# Altium schematic symbol library lib_datalogger.SchLib: 1246 symbols (part 3 of 16) (continued)
## CMP-004-000022-2 (continued)
SAMSUNG ELECTRO-MECHANICS - CL10C150JB8NNNC - CAP, 15PF, 50V, MLCC, 0603; Temperature Coefficient: 300ppm/°C; Dielectric: C0G; Material: Ceramic; ComponentLink3Description: https://datasheet.ciiva.com/16291/cl05b104kq5nnnc-16291631.pdf?src-supplier=Future+Electronics; ComponentLink2URL: https://datasheet.ciiva.com/29198/457290-da-01-en-vs-kondensator-0603-29198776.pdf?src-supplier=Conrad; Voltage: 50V; Design Item ID: CAP CER 15pF 50V NPO 0603 SMD; Mount: Surface Mount; Series: CL; Stock 1: 171550; Voltage Rating (DC): 50V; ComponentLink3URL: https://datasheet.ciiva.com/16291/cl05b104kq5nnnc-16291631.pdf?src-supplier=Future+Electronics; Manufacturer Part Number: CL10C150JB8NNNC; Thickness: 0.035inch; Radiation Hardening: No; ComponentLink1URL: https://datasheet.ciiva.com/15195/getdatasheetpartid-466951-15195798.pdf?src-supplier=Verical; Lead Free: Lead Free; Construction: Flat; Width: 0.031inch; Height: 0.8mm; Category: Ceramic Capacitors; Depth: 0.8mm; Source: mits.SchLib; Pricing 1: 50=0,00900, 500=0,00690, 1500=0,00650, 5000=0,00610, 25000=0,00600, 50000=0,00590, 50=0,00870, 500=0,00670, 1500=0,00630, 5000=0,00590, 25000=0,00580, 50000=0,00570, 50=0,04530, 500=0,03480, 1500=0,03290, 5000=0,03090, 25000=0,03020, 50000=0,02960, 50=0,04360, 500=0,03350, 1500=0,03160, 5000=0,02970, 25000=0,02910, 50000=0,02840, 50=0,00590, 500=0,00450, 1500=0,00420, 5000=0,00400, 25000=0,00390, 50000=0,00380, 50=0,00500, 500=0,00380, 1500=0,00360, 5000=0,00340, 25000=0,00330, 50000=0,00330, 50=0,05360, 500=0,04120, 1500=0,03890, 5000=0,03650, 25000=0,03580, 50000=0,03500, 50=0,75810, 500=0,58230, 1500=0,54930, 5000=0,51640, 25000=0,50540, 50000=0,49440, 50=0,02860, 500=0,02200, 1500=0,02070, 5000=0,01950, 25000=0,01910, 50000=0,01860, 50=0,52200, 500=0,40090, 1500=0,37830, 5000=0,35560, 25000=0,34800, 50000=0,34040, 50=0,05990, 500=0,04600, 1500=0,04340, 5000=0,04080, 25000=0,03990, 50000=0,03910, 50=0,00930, 500=0,00710, 1500=0,00670, 5000=0,00630, 25000=0,00620, 50000=0,00610, 50=0,00690, 500=0,00530, 1500=0,00500, 5000=0,00470, 25000=0,00460, 50000=0,00450 (AUD); Length: 1.6mm; ComponentLink1Description: https://datasheet.ciiva.com/15195/getdatasheetpartid-466951-15195798.pdf?src-supplier=Verical; Case Code (Imperial): 0603; Contact Plating: Tin; RoHS: Yes; Case Code (Metric): 1608; ComponentLink2Description: https://datasheet.ciiva.com/29198/457290-da-01-en-vs-kondensator-0603-29198776.pdf?src-supplier=Conrad
footprint CC1005-0402 (Chip Capacitor; Body 0.039" L x 0.020" W (1.00mm x 0.50mm))
footprint CC1608-0603 (Chip Capacitor; Body 1.6 x 0.8 mm (LxW typ))
pins: 1, 2

## CMP-004-00022-3
designator D?, comment 1SS400CSFH
Switching Diode (High Speed Switching), 80 V, 100 mA, 2-Pin SOD-923, RoHS, Tape and Reel; Pins: 2; Mounting Technology: SMT
footprint ROHM-VMN2-2_V (VMN2, 2-Leads, Body 0.9x0.6mm, Pitch 0.95mm)
footprint ROHM-VMN2-2_V (VMN2, 2-Leads, Body 0.9x0.6mm, Pitch 0.95mm)
pins: 1 K, 2 A

## CMP-004-000023-2
designator C?, comment CAP CER 18PF 50V NP0 0805 SMD  Packaging: Cut Tape (CT)  Capacitance: 18pF  Tolerance: ±10%  Manufacturer: Kemet
CAP CER 18PF 50V NP0 0805; Manufacturer Part Number: C0805C180K5GACTU; Temperature Coefficient: C0G, NP0; Lead Spacing: -; Ratings: -; ComponentLink1URL: http://www.kemet.com/docfinder?Partnumber=C0805C180K5GACTU; Thickness (Max): 0.035" (0.88mm); Mounting Type: Surface Mount, MLCC; Applications: General Purpose; Operating Temperature: -55°C ~ 125°C; Source: mits.SchLib; Category: Capacitors; Design Item ID: CAP CER 18PF 50V NP0 0805 SMD; Pricing 1: 1=0.1, 10=0.057, 50=0.0312, 100=0.0255, 250=0.02132, 500=0.0182, 1000=0.0143 (USD); Voltage - Rated: 50V; Lead Style: -; ComponentLink1Description: http://www.kemet.com/docfinder?Partnumber=C0805C180K5GACTU; RoHS: RoHS Compliant; Package / Case: 0805 (2012 Metric); Height - Seated (Max): -; Stock 1: 48709; Features: Low ESL; Size / Dimension: 0.079" L x 0.049" W (2.00mm x 1.25mm)
footprint CC1005-0402 (Chip Capacitor; Body 0.039" L x 0.020" W (1.00mm x 0.50mm))
footprint CC2012-0805 (Chip Capacitor)
pins: 1, 2

## CMP-004-00023-3
designator D?, comment ESDA25P35-1U1M
TVS DIODE 22V 41V 1610; Peak Inverse Voltage: 23.3V; Max Surge Current: 35A; Mounting Technology: SMT; Case/Package: QFN1610 (0603); RoHS Compliant: Yes; Pins: 2
footprint STM-QFN1610 (SMD, 2-Leads, Body 1.6x1mm)
footprint STM-QFN1610 (SMD, 2-Leads, Body 1.6x1mm)
pins: 1 A, 2 A

## CMP-004-000024-2
designator C?, comment CAP CER 20pF 50V NPO 0603 SMD  Tolerance: ±5%  Max Operating Temperature: 125°C  Packaging: Cut Tape (CT)  Capacitance: 47pF  Voltage Rating: 50V  RoHS Compliant: Yes  Min Operating Temperature: -55°C  Case/Package: 0603  Package Quantity: 1  Manufacturer: Kemet
20 pF, 50 V, 0603 [1608 Metric], ± 5%, C0G / NP0, CL Series; Manufacturer Part Number: C0603C470J1GACTU; Voltage - Rated: 100V; Temperature Coefficient: C0G, NP0; ComponentLink2URL: https://datasheet.ciiva.com/26877/getdatasheetpartid-640634-26877974.pdf?src-supplier=Verical; Height: 0.8mm; ComponentLink1Description: http://www.kemet.com/docfinder?Partnumber=C0603C470J1GACTU; Applications: General Purpose; Size / Dimension: 0.063" L x 0.031" W (1.60mm x 0.80mm); Package / Case: 0603 (1608 Metric); Pricing 2: 50=0,00820, 500=0,00630, 1500=0,00600, 5000=0,00560, 25000=0,00550, 50000=0,00540, 50=0,00790, 500=0,00610, 1500=0,00580, 5000=0,00540, 25000=0,00530, 50000=0,00520, 50=0,04120, 500=0,03140, 1500=0,03010, 5000=0,02810, 25000=0,02750, 50000=0,02680, 50=0,03970, 500=0,03030, 1500=0,02900, 5000=0,02710, 25000=0,02650, 50000=0,02590, 50=0,00530, 500=0,00410, 1500=0,00390, 5000=0,00360, 25000=0,00360, 50000=0,00350, 50=0,00460, 500=0,00350, 1500=0,00330, 5000=0,00310, 25000=0,00300, 50000=0,00300, 50=0,04890, 500=0,03730, 1500=0,03570, 5000=0,03340, 25000=0,03260, 50000=0,03190, 50=0,69060, 500=0,52610, 1500=0,50420, 5000=0,47130, 25000=0,46040, 50000=0,44940, 50=0,02610, 500=0,01990, 1500=0,01910, 5000=0,01780, 25000=0,01740, 50000=0,01700, 50=0,47890, 500=0,36490, 1500=0,34970, 5000=0,32690, 25000=0,31930, 50000=0,31170, 50=0,05440, 500=0,04150, 1500=0,03970, 5000=0,03720, 25000=0,03630, 50000=0,03540, 50=0,00850, 500=0,00650, 1500=0,00620, 5000=0,00580, 25000=0,00570, 50000=0,00550, 50=0,00630, 500=0,00480, 1500=0,00460, 5000=0,00430, 25000=0,00420, 50000=0,00410 (AUD); Lead Spacing: -; Case Code (Metric): 1608; Ratings: -; Design Item ID: CAP CER 20pF 50V NPO 0603 SMD; Case Code (Imperial): 0603; Lead Style: -; Depth: 0.8mm; ComponentLink2Description: https://datasheet.ciiva.com/26877/getdatasheetpartid-640634-26877974.pdf?src-supplier=Verical; Stock 2: 273250; Thickness: 0.035inch; Mounting Type: Surface Mount, MLCC; ComponentLink3URL: https://datasheet.ciiva.com/26310/mlcc-catalogdownload2013-eng-26310315.pdf?src-supplier=Distrelec; Length: 1.6mm; RoHS: RoHS Compliant; Radiation Hardening: No; Source: mits.SchLib; Operating Temperature: -55°C ~ 125°C; Construction: Flat; Voltage: 50V; Dielectric: C0G; ComponentLink1URL: http://www.kemet.com/docfinder?Partnumber=C0603C470J1GACTU; Mount: Surface Mount; Part Status: Active; Features: Low ESL; Thickness (Max): 0.034" (0.87mm); Width: 0.031inch; Category: Capacitors; Stock 1: 275177; ComponentLink3Description: https://datasheet.ciiva.com/26310/mlcc-catalogdownload2013-eng-26310315.pdf?src-supplier=Distrelec; Height - Seated (Max): -; Series: CL; Pricing 1: 1=0.1, 10=0.041, 50=0.0222, 100=0.0187, 250=0.01532, 500=0.0131, 1000=0.0102 (USD)
footprint CC1005-0402 (Chip Capacitor; Body 0.039" L x 0.020" W (1.00mm x 0.50mm))
footprint CC1608-0603 (Chip Capacitor; Body 1.6 x 0.8 mm (LxW typ))
pins: 1, 2

## CMP-004-00024-3
designator D?, comment MSS1P4-M3/89A
Schottky Diodes & Rectifiers 1.0 Amp 40 Volt; Forward Voltage: 460mV; Max Surge Current: 25A; Max Operating Temperature: 150°C; Min Operating Temperature: -55°C; Pins: 2; Mounting Technology: SMT
footprint MicroSMP (DO-219AD) (SOD, 2-Leads, Body 2.3x1.4mm)
footprint MicroSMP (DO-219AD) (SOD, 2-Leads, Body 2.3x1.4mm)
pins: 1 K, 2 A

## CMP-004-00025-1
designator U?, comment ESDR0502NMUTBG
Ultra Low Capacitance ESD Protection Array for High Speed Data Line Protection, 6-Pin UDFN, Pb-Free, Tape and Reel; ComponentLink2Description: Datasheet; ComponentLink3URL: http://www.onsemi.com/pub_link/Collateral/517AA.PDF; Mounting Technology: SMT; ComponentLink1URL: http://www.onsemi.com/; Pins: 6; ComponentLink3Description: Package Specification; ComponentLink1Description: Manufacturer URL; ComponentLink2URL: http://www.onsemi.cn/pub_link/Collateral/ESDR0502N-D.PDF
footprint ONSC-UDFN-6-517AA-01_V (SON, 6-Leads, Body 1.2x1mm, Pitch 0.4mm)
footprint ONSC-UDFN-6-517AA-01_V (SON, 6-Leads, Body 1.2x1mm, Pitch 0.4mm)
pins: 1 GND (power), 2 NC, 3 NC, 4 D-, 5 D+, 6 VBUS (power)

## CMP-004-000025-2
designator C?, comment CAP CER 22nF 50V C0G 1206 SMD  Tolerance: ±5%  Capacitance: 0.022µF  Packaging: Cut Tape (CT)  Manufacturer: TDK Corporation
CAP CER 0.022UF 50V C0G 1206; Manufacturer Part Number: C3216C0G1H223J060AA; Temperature Coefficient: C0G, NP0; Operating Temperature: -55°C ~ 125°C; Failure Rate: -; Package / Case: 1206 (3216 Metric); Source: mits.SchLib; Applications: General Purpose; Lead Spacing: -; Height - Seated (Max): -; Stock 1: 9101; Size / Dimension: 0.126" L x 0.063" W (3.20mm x 1.60mm); Design Item ID: CAP CER 22nF 50V C0G 1206 SMD; Thickness (Max): 0.028" (0.70mm); RoHS: RoHS Compliant; Mounting Type: Surface Mount, MLCC; Ratings: -; ComponentLink1Description: https://product.tdk.com/info/en/catalog/datasheets/mlcc_commercial_general_en.pdf; Voltage - Rated: 50V; Category: Capacitors; Features: Low ESL; Part Status: Active; ComponentLink1URL: https://product.tdk.com/info/en/catalog/datasheets/mlcc_commercial_general_en.pdf; Lead Style: -; Pricing 1: 1=0.48, 10=0.417, 100=0.2086, 250=0.16684, 500=0.15196, 1000=0.13706 (USD)
footprint CC1005-0402 (Chip Capacitor; Body 0.039" L x 0.020" W (1.00mm x 0.50mm))
footprint CC3216-1206 (Chip Capacitor; Body 3.2 x 1.6 mm (LxW typ))
pins: 1, 2

## CMP-004-000026-2
designator C?, comment CAP CER 22pF 50V C0G 0603 SMD  Packaging: Tape and Reel  Manufacturer: Samsung  Voltage Rating: 50V  Package Quantity: 1  Case/Package: 0603  Max Operating Temperature: 125°C  Tolerance: 5%  Min Operating Temperature: -55°C  Capacitance: 22pF  RoHS Compliant: Yes
Ceramic capacitor SMD-0603 22pF /50V NP0# J +-5%, Samsung, RoHS; Manufacturer Part Number: CL10C220JB8NNNC; Temperature Coefficient: 300ppm/°C; ComponentLink4URL: https://datasheet.ciiva.com/16440/l0005e-16440552.pdf?src-supplier=Future+Electronics; Case Code (Metric): 1608; Length: 0.063inch; RoHS: Yes; ComponentLink6Description: https://datasheet.ciiva.com/25803/cl10c220jb8nnnc-25803014.pdf?src-supplier=Digi-Key; Series: CL; Mount: Surface Mount; ComponentLink8Description: https://datasheet.ciiva.com/26310/mlcc-catalogdownload2013-eng-26310317.pdf?src-supplier=Distrelec; ComponentLink3Description: https://datasheet.ciiva.com/29200/453714-da-01-en-vs-kondensator-0402-29200051.pdf?src-supplier=Conrad; Pricing 1: 4000=0,01248, 8000=0,01245, 16000=0,01242, 24000=0,01191, 32000=0,01188, 40000=0,01186, 400000=0,01231 (USD); Width: 0.031inch; Voltage Rating (DC): 50V; ComponentLink7Description: https://datasheet.ciiva.com/29198/457135-da-01-en-vs-kondensator-0603-29198750.pdf?src-supplier=Conrad; ComponentLink2Description: https://datasheet.ciiva.com/18184/getdatasheetpartid-316063-18184267.pdf?src-supplier=Verical; ComponentLink2URL: https://datasheet.ciiva.com/18184/getdatasheetpartid-316063-18184267.pdf?src-supplier=Verical; Radiation Hardening: No; ComponentLink4Description: https://datasheet.ciiva.com/16440/l0005e-16440552.pdf?src-supplier=Future+Electronics; Height: 0.8mm; ComponentLink6URL: https://datasheet.ciiva.com/25803/cl10c220jb8nnnc-25803014.pdf?src-supplier=Digi-Key; Thickness: 0.035inch; Depth: 0.8mm; Design Item ID: CAP CER 22pF 50V C0G 0603 SMD; ComponentLink1URL: https://datasheet.ciiva.com/6277/product-6277809.pdf?src-supplier=Digi-Key; Material: Ceramic; Category: Ceramic Capacitors; Source: mits.SchLib; Voltage: 50V; ComponentLink5Description: https://datasheet.ciiva.com/7828/1666664-7828846.pdf?src-supplier=Element14; ComponentLink5URL: https://datasheet.ciiva.com/7828/1666664-7828846.pdf?src-supplier=Element14; Contact Plating: Tin; Dielectric: C0G; ComponentLink3URL: https://datasheet.ciiva.com/29200/453714-da-01-en-vs-kondensator-0402-29200051.pdf?src-supplier=Conrad; ComponentLink1Description: https://datasheet.ciiva.com/6277/product-6277809.pdf?src-supplier=Digi-Key; Stock 1: 92000; Case Code (Imperial): 0603; ComponentLink9URL: https://datasheet.ciiva.com/16387/cl05b104kq5nnnc-16387334.pdf?src-supplier=Future+Electronics; Lead Free: Lead Free; ComponentLink8URL: https://datasheet.ciiva.com/26310/mlcc-catalogdownload2013-eng-26310317.pdf?src-supplier=Distrelec; ComponentLink7URL: https://datasheet.ciiva.com/29198/457135-da-01-en-vs-kondensator-0603-29198750.pdf?src-supplier=Conrad; ComponentLink9Description: https://datasheet.ciiva.com/16387/cl05b104kq5nnnc-16387334.pdf?src-supplier=Future+Electronics
footprint CC1005-0402 (Chip Capacitor; Body 0.039" L x 0.020" W (1.00mm x 0.50mm))
footprint CC1608-0603 (Chip Capacitor; Body 1.6 x 0.8 mm (LxW typ))
pins: 1, 2

## CMP-004-00026-3
designator D?, comment NSR30CM3T5G
Dual Common Cathode Schottky Barrier Diodes, 3-Pin SOT-723, Pb-Free, Tape and Reel; ComponentLink1Description: Manufacturer URL; ComponentLink1URL: http://www.onsemi.com/; Mounting Technology: SMT; ComponentLink3Description: Package Specification; ComponentLink2URL: http://www.onsemi.cn/pub_link/Collateral/NSR30CM3T5G-D.PDF; ComponentLink3URL: http://www.onsemi.cn/pub_link/Collateral/BAT54M3-D.PDF; Pins: 3; ComponentLink2Description: Datasheet
footprint ONSC-SOT-723-3-631AA-01_C_V (SOT23, 3-Leads, Body 1.25x0.85mm, Pitch 0.4mm)
footprint ONSC-SOT-723-3-631AA-01_C_V (SOT23, 3-Leads, Body 1.25x0.85mm, Pitch 0.4mm)
pins: 1 A1, 2 A2, 3 K

## CMP-004-000027-1
designator C?, comment CAP CER 22uF 10V 20% 0603 SMD  Max Operating Temperature: 85°C  Voltage Rating: 10V  Min Operating Temperature: -55°C  Manufacturer: Samsung  Packaging: Tape and Reel  Tolerance: 20%  Capacitance: 22uF  Case/Package: 0603  RoHS Compliant: Yes
Cap Ceramic 22uF 10V X5R 20% SMD 0603 85°C Embossed T/R; Manufacturer Part Number: CL10A226MP8NUNE; Pricing 1: 20=0,04000, 200=0,03050, 600=0,02880, 2000=0,02700, 10000=0,02620, 20000=0,02590, 20=0,03860, 200=0,02940, 600=0,02770, 2000=0,02600, 10000=0,02520, 20000=0,02500, 20=0,20020, 200=0,15240, 600=0,14390, 2000=0,13480, 10000=0,13080, 20000=0,12950, 20=0,19300, 200=0,14690, 600=0,13870, 2000=0,12990, 10000=0,12610, 20000=0,12490, 20=0,02590, 200=0,01970, 600=0,01860, 2000=0,01740, 10000=0,01690, 20000=0,01670, 20=0,02220, 200=0,01690, 600=0,01600, 2000=0,01490, 10000=0,01450, 20000=0,01440, 20=0,23770, 200=0,18100, 600=0,17090, 2000=0,16000, 10000=0,15540, 20000=0,15380, 20=3,35420, 200=2,55400, 600=2,41150, 2000=2,25800, 10000=2,19230, 20000=2,17040, 20=0,12690, 200=0,09660, 600=0,09120, 2000=0,08540, 10000=0,08290, 20000=0,08210, 20=2,32600, 200=1,77110, 600=1,67230, 2000=1,56590, 10000=1,52030, 20000=1,50510, 20=0,26440, 200=0,20130, 600=0,19010, 2000=0,17800, 10000=0,17280, 20000=0,17110, 20=0,04120, 200=0,03140, 600=0,02960, 2000=0,02770, 10000=0,02690, 20000=0,02660, 20=0,03060, 200=0,02330, 600=0,02200, 2000=0,02060, 10000=0,02000, 20000=0,01980 (AUD); Category: Ceramic Capacitors; Series: CL; Stock 1: 377320; Dielectric: X5R; Height: 0.8mm; ComponentLink2Description: https://datasheet.ciiva.com/26838/getdatasheetpartid-746477-26838370.pdf?src-supplier=Verical; Length: 1.6mm; Contact Plating: Tin; Case Code (Metric): 1608; Thickness: 0.035inch; ComponentLink1URL: https://datasheet.ciiva.com/25711/cl10a226mp8nune-25711532.pdf?src-supplier=Digi-Key; Width: 0.031inch; Case Code (Imperial): 0603; Source: mits.SchLib; Mount: Surface Mount; Radiation Hardening: No; RoHS: Yes; Depth: 0.8mm; ComponentLink1Description: https://datasheet.ciiva.com/25711/cl10a226mp8nune-25711532.pdf?src-supplier=Digi-Key; Construction: Flat; ComponentLink2URL: https://datasheet.ciiva.com/26838/getdatasheetpartid-746477-26838370.pdf?src-supplier=Verical; Lead Free: Lead Free; Design Item ID: CAP CER 22uF 10V 20% 0603 SMD
footprint CR1608-0603 (Chip Resistor; Body 1.6 x 0.8 mm (LxW typ))
footprint CR1608-0603 (Chip Resistor; Body 1.6 x 0.8 mm (LxW typ))
pins: 1, 2

## CMP-004-00027-3
designator D?, comment DAN222M3T5G
Common Cathode Silicon Dual Switching Diodes, 3-Pin SOT-723, Pb-Free, Tape and Reel; Forward Current: 100mA; ComponentLink2URL: http://www.onsemi.cn/pub_link/Collateral/DAN222M3-D.PDF; ComponentLink3Description: Package Specification; Pins: 3; ComponentLink2Description: Datasheet; ComponentLink3URL: http://www.onsemi.com/pub_link/Collateral/631AA.PDF; ComponentLink1URL: http://www.onsemi.com/; Mounting Technology: SMT; ComponentLink1Description: Manufacturer URL
footprint ROHM-SOT723-3_V (SOT723, 3-Leads, Body 1.2x0.8mm, Pitch 0.8mm)
footprint ROHM-SOT723-3_V (SOT723, 3-Leads, Body 1.2x0.8mm, Pitch 0.8mm)
pins: 1 A1, 2 A2, 3 K

## CMP-004-000028-2
designator C?, comment CAP CER 24pF 50V NPO 0603 SMD  Package Quantity: 1  Capacitance: 24pF  Packaging: Tape and Reel  Voltage Rating: 50V  Manufacturer: Samsung  Case/Package: 0603  RoHS Compliant: Yes  Max Operating Temperature: 125°C  Min Operating Temperature: -55°C  Tolerance: 5%
Cap Ceramic 24pF 50V C0G 5% SMD 0603 125C Paper T/R; Manufacturer Part Number: CL10C240JB8NNNC; Construction: Flat; ComponentLink2URL: https://datasheet.ciiva.com/15195/getdatasheetpartid-356444-15195810.pdf?src-supplier=Verical; Stock 1: 49750; Design Item ID: CAP CER 24pF 50V NPO 0603 SMD; ComponentLink1URL: https://datasheet.ciiva.com/16449/cl10c240jb8nnnc-16449236.pdf?src-supplier=Future+Electronics; Dielectric: C0G; Case Code (Imperial): 0603; ComponentLink1Description: https://datasheet.ciiva.com/16449/cl10c240jb8nnnc-16449236.pdf?src-supplier=Future+Electronics; Length: 1.6mm; Mount: Surface Mount; Category: Ceramic Capacitors; Series: CL; Height: 0.8mm; Width: 0.031inch; Pricing 1: 50=0,00920, 500=0,00710, 1500=0,00670, 5000=0,00630, 25000=0,00610, 50000=0,00600, 50=0,00880, 500=0,00680, 1500=0,00640, 5000=0,00600, 25000=0,00590, 50000=0,00580, 50=0,04600, 500=0,03550, 1500=0,03350, 5000=0,03150, 25000=0,03090, 50000=0,03020, 50=0,04410, 500=0,03400, 1500=0,03210, 5000=0,03020, 25000=0,02960, 50000=0,02900, 50=0,00590, 500=0,00460, 1500=0,00430, 5000=0,00410, 25000=0,00400, 50000=0,00390, 50=0,00500, 500=0,00390, 1500=0,00370, 5000=0,00350, 25000=0,00340, 50000=0,00330, 50=0,05440, 500=0,04200, 1500=0,03970, 5000=0,03730, 25000=0,03650, 50000=0,03580, 50=0,77170, 500=0,59530, 1500=0,56220, 5000=0,52910, 25000=0,51810, 50000=0,50710, 50=0,02900, 500=0,02230, 1500=0,02110, 5000=0,01990, 25000=0,01940, 50000=0,01900, 50=0,53580, 500=0,41330, 1500=0,39040, 5000=0,36740, 25000=0,35980, 50000=0,35210, 50=0,06100, 500=0,04700, 1500=0,04440, 5000=0,04180, 25000=0,04090, 50000=0,04010, 50=0,00940, 500=0,00720, 1500=0,00680, 5000=0,00640, 25000=0,00630, 50000=0,00620, 50=0,00700, 500=0,00540, 1500=0,00510, 5000=0,00480, 25000=0,00470, 50000=0,00460 (AUD); Radiation Hardening: No; Thickness: 0.035inch; ComponentLink2Description: https://datasheet.ciiva.com/15195/getdatasheetpartid-356444-15195810.pdf?src-supplier=Verical; Depth: 0.8mm; RoHS: Yes; Source: mits.SchLib; Case Code (Metric): 1608
footprint CC1005-0402 (Chip Capacitor; Body 0.039" L x 0.020" W (1.00mm x 0.50mm))
footprint CC1608-0603 (Chip Capacitor; Body 1.6 x 0.8 mm (LxW typ))
pins: 1, 2

## CMP-004-00028-3
designator D?, comment RB520CM-30
DIODE SCHOTTKY 30V 100MA VMN2M; Case/Package: SMD/SMT; Pins: 2; Mounting Technology: SMT
footprint MicroSMP (DO-219AD) (SOD, 2-Leads, Body 2.3x1.4mm)
footprint ROHM-VMN2-2_V (VMN2, 2-Leads, Body 0.9x0.6mm, Pitch 0.95mm)
pins: 1 K, 2 A

## CMP-004-000029-2
designator C?, comment CAP CER 33nF 50V C0G 0603 SMD  Package Quantity: 1  Max Operating Temperature: 125°C  Manufacturer: Samsung  Capacitance: 33nF  Voltage Rating: 50V  Case/Package: 0603  Packaging: Tape and Reel  Min Operating Temperature: -55°C  Tolerance: 10%
CAP CER 0.033UF 50V X7R 0603; Manufacturer Part Number: CL10B333KB8NNNC; Material: Ceramic; ComponentLink1Description: https://product.tdk.com/info/en/catalog/datasheets/mlcc_commercial_general_en.pdf; ComponentLink5URL: https://datasheet.ciiva.com/16500/cl05b104kq5nnnc-16500696.pdf?src-supplier=Future+Electronics; ComponentLink5Description: https://datasheet.ciiva.com/16500/cl05b104kq5nnnc-16500696.pdf?src-supplier=Future+Electronics; Height: 0.8mm; ComponentLink4URL: https://datasheet.ciiva.com/29198/457066-da-01-en-vs-kondensator-0603-29198738.pdf?src-supplier=Conrad; ComponentLink2Description: https://api.kemet.com/component-edge/download/datasheet/C0805C472K5RECAUTO.pdf?src-supplier=Digi-Key; RoHS: Yes; Dielectric: X7R; ComponentLink4Description: https://datasheet.ciiva.com/29198/457066-da-01-en-vs-kondensator-0603-29198738.pdf?src-supplier=Conrad; ComponentLink1URL: https://product.tdk.com/info/en/catalog/datasheets/mlcc_commercial_general_en.pdf; Source: mits.SchLib; Case Code (Metric): 1608; Pricing 1: 50=0,00940, 500=0,00720, 1500=0,00680, 5000=0,00640, 25000=0,00620, 50000=0,00620, 50=0,00910, 500=0,00690, 1500=0,00660, 5000=0,00620, 25000=0,00590, 50000=0,00590, 50=0,04710, 500=0,03600, 1500=0,03400, 5000=0,03210, 25000=0,03070, 50000=0,03070, 50=0,04540, 500=0,03470, 1500=0,03280, 5000=0,03090, 25000=0,02960, 50000=0,02960, 50=0,00610, 500=0,00470, 1500=0,00440, 5000=0,00410, 25000=0,00400, 50000=0,00400, 50=0,00520, 500=0,00400, 1500=0,00380, 5000=0,00360, 25000=0,00340, 50000=0,00340, 50=0,05590, 500=0,04270, 1500=0,04040, 5000=0,03810, 25000=0,03650, 50000=0,03650, 50=0,78920, 500=0,60290, 1500=0,57000, 5000=0,53710, 25000=0,51520, 50000=0,51520, 50=0,02990, 500=0,02280, 1500=0,02160, 5000=0,02030, 25000=0,01950, 50000=0,01950, 50=0,54730, 500=0,41810, 1500=0,39530, 5000=0,37250, 25000=0,35730, 50000=0,35730, 50=0,06220, 500=0,04750, 1500=0,04490, 5000=0,04230, 25000=0,04060, 50000=0,04060, 50=0,00970, 500=0,00740, 1500=0,00700, 5000=0,00660, 25000=0,00630, 50000=0,00630, 50=0,00720, 500=0,00550, 1500=0,00520, 5000=0,00490, 25000=0,00470, 50000=0,00470 (AUD); Mount: Surface Mount; ComponentLink2URL: https://api.kemet.com/component-edge/download/datasheet/C0805C472K5RECAUTO.pdf?src-supplier=Digi-Key; Length: 1.6mm; Stock 1: 854200; Voltage: 50V; Case Code (Imperial): 0603; ComponentLink6Description: https://datasheet.ciiva.com/26310/mlcc-catalogdownload2013-eng-26310287.pdf?src-supplier=Distrelec; Category: Ceramic Capacitors; Radiation Hardening: No; ComponentLink3URL: https://datasheet.ciiva.com/15195/getdatasheetpartid-359558-15195751.pdf?src-supplier=Verical; ComponentLink6URL: https://datasheet.ciiva.com/26310/mlcc-catalogdownload2013-eng-26310287.pdf?src-supplier=Distrelec; Thickness: 0.035inch; Depth: 0.8mm; ComponentLink3Description: https://datasheet.ciiva.com/15195/getdatasheetpartid-359558-15195751.pdf?src-supplier=Verical; Design Item ID: CAP CER 33nF 50V C0G 0603 SMD; Width: 0.031inch; Contact Plating: Tin
footprint CC1005-0402 (Chip Capacitor; Body 0.039" L x 0.020" W (1.00mm x 0.50mm))
footprint CC1608-0603 (Chip Capacitor; Body 1.6 x 0.8 mm (LxW typ))
pins: 1, 2

## CMP-004-00029-3
designator D?, comment ESDA24P140-1U3M
TVS diode, 4500W, 22V standoff, 29.5V clamp; Peak Inverse Voltage: 22.7V; Max Surge Current: 140A; Forward Voltage: 700mV; Case/Package: 3-QFN; RoHS Compliant: Yes; Mounting Technology: SMT; Pins: 3
footprint STM-QFN3 (SMD, 3-Leads, Body 2x2mm)
footprint STM-QFN3 (SMD, 3-Leads, Body 2x2mm)
pins: 1 A, 2 A, 3 K

## CMP-004-000030-2
designator C?, comment CAP CER 3PF 100V NP0 0805 SMD  Packaging: Tape and Reel  Max Operating Temperature: 125°C  Min Operating Temperature: -55°C  Package Quantity: 4000  Voltage Rating: 100V  Manufacturer: Kyocera AVX  Case/Package: 0805  Capacitance: 3pF
Cap Ceramic 3pF 100V SMD 0805; Manufacturer Part Number: 08051A3R0CAT2A; Temperature Coefficient: 0ppm/°C; Dissipation Factor: 10%; Dielectric: C0G; Width: 1.25mm; Length: 2.01mm; ComponentLink3URL: https://datasheet.ciiva.com/11536/ccog-11536967.pdf?src-supplier=Avnet; ComponentLink4Description: https://datasheet.ciiva.com/205/ccog-205340.pdf?src-supplier=Digi-Key; Stock 1: 10534; Source: mits.SchLib; Case Code (Imperial): 0805; ComponentLink2Description: https://datasheet.ciiva.com/5415/ccog-243403-5415991.pdf?src-supplier=Mouser; ComponentLink1Description: http://www.kemet.com/docfinder?Partnumber=C0805C100K5GACTU; Thickness: 0.037inch; RoHS: Yes; ComponentLink4URL: https://datasheet.ciiva.com/205/ccog-205340.pdf?src-supplier=Digi-Key; Case Code (Metric): 2012; ComponentLink2URL: https://datasheet.ciiva.com/5415/ccog-243403-5415991.pdf?src-supplier=Mouser; Category: Ceramic Capacitors; Termination: SMD/SMT; Voltage Rating (DC): 100V; ComponentLink3Description: https://datasheet.ciiva.com/11536/ccog-11536967.pdf?src-supplier=Avnet; Height: 0.94mm; Design Item ID: CAP CER 3PF 100V NP0 0805 SMD; Radiation Hardening: No; ComponentLink1URL: http://www.kemet.com/docfinder?Partnumber=C0805C100K5GACTU; Depth: 1.25mm; Mount: Surface Mount; Pricing 1: 1=0,24000, 10=0,16700, 100=0,09460, 500=0,06680, 1000=0,05844 (USD)
footprint CC1005-0402 (Chip Capacitor; Body 0.039" L x 0.020" W (1.00mm x 0.50mm))
footprint CC2012-0805 (Chip Capacitor)
pins: 1, 2

## CMP-004-00030-3
designator D?, comment ESDALC5-1BM2
Single Line Low Capacitance Transil™, 5 V, -55 to 150 degC, 2-Pin SOD-882, RoHS, Tape and Reel; Mounting Technology: SMT; Pins: 2
footprint STM-SOD-882_V (SOD-882, 2-Leads, Body 1x0.6mm)
footprint STM-SOD-882_V (SOD-882, 2-Leads, Body 1x0.6mm)
pins: 1 A, 2 A

## CMP-004-00031-1
designator D?, comment Diodo TVS 20V 1500W Unidirecional SMD SMC
Diodo TVS 20V 1500W Unidirecional SMD SMC DO214AB; Manufacturer Part Number: SMCJ1.5KE20A-TP; Min Breakdown Voltage: 19V; Max Surge Current: 54.9A; Test Current: 1mA; Clamping Voltage: 27.7V; Reverse Standoff Voltage: 17.1V; Number of Channels: 1; Diode Type: ZENER; Polarity: Unidirectional; Power Line Protection: No; Leakage Current: 5uA; Breakdown Voltage: 21V; Peak Pulse Power: 1.5kW; Mount: Surface Mount; Reverse Breakdown Voltage: 19V; Packaging: Tape and Reel; Peak Pulse Current: 54.9A; Series: -; Number of Pins: 2; Termination: SMD/SMT; Case/Package: DO-214AB; RoHS Compliant: Yes; Resistor Type: Zener; Package Quantity: 1; Max Operating Temperature: 175°C; Number of Unidirectional Channels: 1; Min Operating Temperature: -55°C; Number of Elements: 1
footprint R-6
footprint DO-214AB(SMC)
pins: 1 A, 2 K

## CMP-004-000031-2
designator C?, comment CAP CER 47nF 25V NP0 0805 SMD  Capacitance: 0.047µF  Manufacturer: KEMET  Tolerance: ±5%  Packaging: Cut Tape (CT)
CAP CER 0.047UF 25V NP0 0805; Manufacturer Part Number: C0805C473J3GACTU; Temperature Coefficient: C0G, NP0; Lead Style: -; Features: Low ESL; Size / Dimension: 0.079" L x 0.049" W (2.00mm x 1.25mm); Part Status: Active; Mounting Type: Surface Mount, MLCC; RoHS: RoHS Compliant; Package / Case: 0805 (2012 Metric); Voltage - Rated: 25V; Ratings: -; Thickness (Max): 0.055" (1.40mm); Lead Spacing: -; Design Item ID: CAP CER 47nF 25V NP0 0805 SMD; Applications: General Purpose; Pricing 1: 1=0.72, 10=0.51, 25=0.4352, 50=0.3854, 100=0.3356, 250=0.28588, 500=0.2486, 1000=0.21131 (USD); Category: Capacitors; Failure Rate: -; Stock 1: 51647; Operating Temperature: -55°C ~ 125°C; Source: mits.SchLib; ComponentLink1Description: http://www.kemet.com/docfinder?Partnumber=C0805C473J3GACTU; Height - Seated (Max): -; ComponentLink1URL: http://www.kemet.com/docfinder?Partnumber=C0805C473J3GACTU
footprint CC1005-0402 (Chip Capacitor; Body 0.039" L x 0.020" W (1.00mm x 0.50mm))
footprint CC2012-0805 (Chip Capacitor)
pins: 1, 2

## CMP-004-00032-1
designator D?, comment Diodo TVS 600W 5.8V Bidirecional SMD
Diodo TVS, 600W, 5.8V, Bidirecional, SMD SMBJ DO-214AA; Manufacturer Part Number: SMBJP6KE6.8CA-TP; Breakdown Voltage: 7.14V; Min Breakdown Voltage: 6.45V; Polarity: Bidirectional; Peak Pulse Current: 58.1A; Diode Type: ZENER; Number of Channels: 1; Power Line Protection: No; Clamping Voltage: 10.5V; Max Operating Temperature: 175°C; Case/Package: DO-214AA; RoHS Compliant: Yes; Packaging: Tape and Reel; Package Quantity: 3000; Resistor Type: Zener; Series: SMBJ; Number of Pins: 2; Min Operating Temperature: -55°C; Termination: SMD/SMT; Peak Pulse Power: 600W; Mount: Surface Mount; Max Surge Current: 58.1A; Number of Bidirectional Channels: 1; Reverse Standoff Voltage: 5.8V
footprint DO-214AA(SMB)
footprint DO-214AA(SMB)
pins: 1 A, 2 K

## CMP-004-000032-2
designator C?, comment CAP CER 47pF 50V NP0 0603 SMD  Package Quantity: 1  Capacitance: 47pF  Tolerance: 5%  Min Operating Temperature: -55°C  Packaging: Tape and Reel  Max Operating Temperature: 125°C  Case/Package: 0603  Manufacturer: Samsung  Voltage Rating: 50V  RoHS Compliant: Yes
CAP CER 47PF 50V C0G/NP0 0603; Manufacturer Part Number: CL10C470JB8NNNC; Temperature Coefficient: 300ppm/°C; Dielectric: C0G; Material: Ceramic; Length: 1.6mm; Series: CL; RoHS: Yes; ComponentLink2Description: https://datasheet.ciiva.com/26838/getdatasheetpartid-359564-26838540.pdf?src-supplier=Verical; ComponentLink1URL: https://datasheet.ciiva.com/25803/cl10c470jb8nnnc-25803543.pdf?src-supplier=Digi-Key; Voltage: 50V; Voltage Rating (DC): 50V; Lead Free: Lead Free; ComponentLink3Description: https://datasheet.ciiva.com/29198/456890-da-01-en-vs-kondensator-0603-29198885.pdf?src-supplier=Conrad; ComponentLink4Description: https://datasheet.ciiva.com/26310/mlcc-catalogdownload2013-eng-26310294.pdf?src-supplier=Distrelec; ComponentLink2URL: https://datasheet.ciiva.com/26838/getdatasheetpartid-359564-26838540.pdf?src-supplier=Verical; Thickness: 0.035inch; Design Item ID: CAP CER 47pF 50V NP0 0603 SMD; Depth: 0.8mm; ComponentLink3URL: https://datasheet.ciiva.com/29198/456890-da-01-en-vs-kondensator-0603-29198885.pdf?src-supplier=Conrad; Category: Ceramic Capacitors; Case Code (Imperial): 0603; Stock 1: 970650; Case Code (Metric): 1608; Construction: Flat; Pricing 1: 50=0,00730, 500=0,00550, 1500=0,00510, 5000=0,00480, 25000=0,00460, 50000=0,00460, 50=0,00710, 500=0,00530, 1500=0,00490, 5000=0,00470, 25000=0,00440, 50000=0,00440, 50=0,03680, 500=0,02760, 1500=0,02560, 5000=0,02430, 25000=0,02300, 50000=0,02300, 50=0,03540, 500=0,02650, 1500=0,02460, 5000=0,02340, 25000=0,02210, 50000=0,02210, 50=0,00480, 500=0,00360, 1500=0,00330, 5000=0,00310, 25000=0,00300, 50000=0,00300, 50=0,00410, 500=0,00300, 1500=0,00280, 5000=0,00270, 25000=0,00250, 50000=0,00250, 50=0,04350, 500=0,03260, 1500=0,03030, 5000=0,02880, 25000=0,02720, 50000=0,02720, 50=0,61520, 500=0,46140, 1500=0,42850, 5000=0,40650, 25000=0,38450, 50000=0,38450, 50=0,02320, 500=0,01740, 1500=0,01620, 5000=0,01530, 25000=0,01450, 50000=0,01450, 50=0,42360, 500=0,31770, 1500=0,29500, 5000=0,27990, 25000=0,26480, 50000=0,26480, 50=0,04860, 500=0,03650, 1500=0,03390, 5000=0,03210, 25000=0,03040, 50000=0,03040, 50=0,00750, 500=0,00570, 1500=0,00530, 5000=0,00500, 25000=0,00470, 50000=0,00470, 50=0,00560, 500=0,00420, 1500=0,00390, 5000=0,00370, 25000=0,00350, 50000=0,00350 (AUD); Source: mits.SchLib; Width: 0.031inch; Mount: Surface Mount; ComponentLink4URL: https://datasheet.ciiva.com/26310/mlcc-catalogdownload2013-eng-26310294.pdf?src-supplier=Distrelec; Height: 0.8mm; Radiation Hardening: No; ComponentLink1Description: https://datasheet.ciiva.com/25803/cl10c470jb8nnnc-25803543.pdf?src-supplier=Digi-Key
footprint CC1005-0402 (Chip Capacitor; Body 0.039" L x 0.020" W (1.00mm x 0.50mm))
footprint CC1608-0603 (Chip Capacitor; Body 1.6 x 0.8 mm (LxW typ))
pins: 1, 2

## CMP-004-000033-1
designator C?, comment CAP CER 47uF 10V X7R 1210 SMD  Packaging: Cut Tape (CT)  Tolerance: ±10%  Manufacturer: Murata Electronics North America  Capacitance: 47µF
CAP CER 47UF 10V X7R 1210; Manufacturer Part Number: GRM32ER71A476KE15L; Mounting Type: Surface Mount, MLCC; RoHS: RoHS Compliant; Applications: General Purpose; ComponentLink1URL: http://www.murata.com/~/media/webrenewal/support/library/catalog/products/capacitor/mlcc/c02e.pdf; Stock 1: 195496; Voltage - Rated: 10V; Source: mits.SchLib; Features: -; Pricing 1: 1=1.24, 10=1.034, 50=0.836, 100=0.66 (USD); Height - Seated (Max): -; Package / Case: 1210 (3225 Metric); Operating Temperature: -55°C ~ 125°C; Design Item ID: CAP CER 47uF 10V X7R 1210 SMD; Lead Spacing: -; Category: Capacitors; Temperature Coefficient: X7R; Thickness (Max): 0.106" (2.70mm); Size / Dimension: 0.126" L x 0.098" W (3.20mm x 2.50mm); ComponentLink1Description: http://www.murata.com/~/media/webrenewal/support/library/catalog/products/capacitor/mlcc/c02e.pdf; Lead Style: -; Ratings: -
footprint CC3225-1210 (Chip Capacitor; Body 1.6 x 0.8 mm (LxW typ))
footprint CC3225-1210 (Chip Capacitor; Body 1.6 x 0.8 mm (LxW typ))
pins: 1, 2
1 alternate drawing of the same symbol

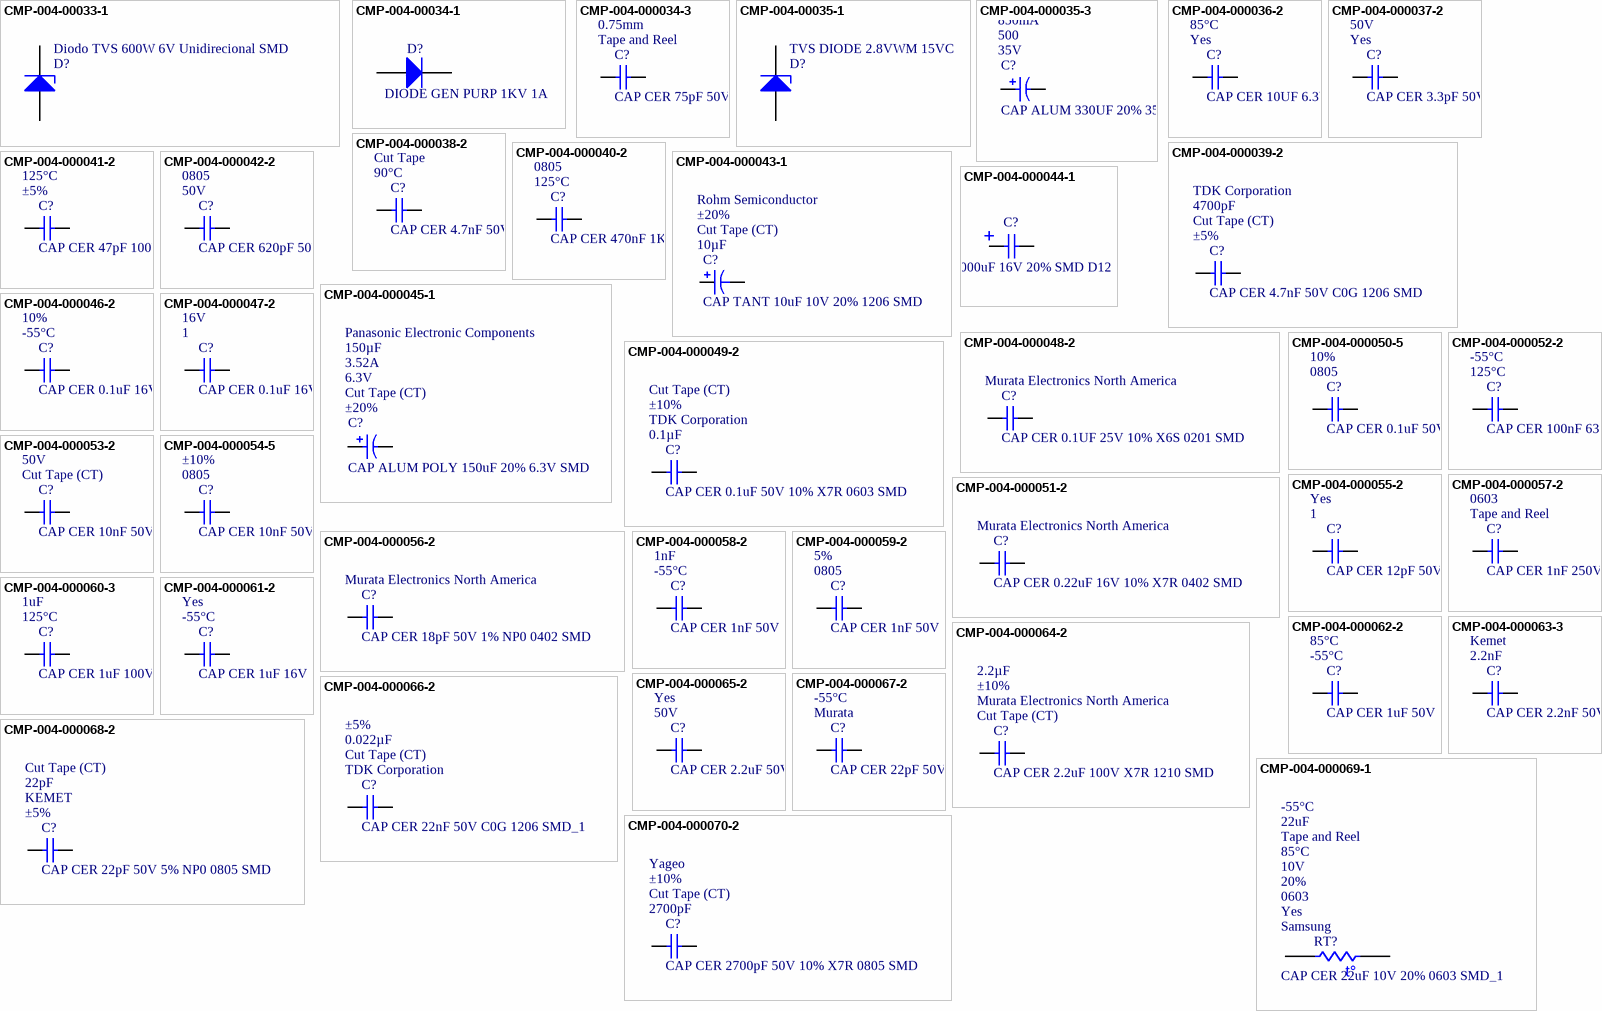
[diagram p9: symbols CMP-004-00033-1 to CMP-004-000070-2]

## CMP-004-00033-1
designator D?, comment Diodo TVS 600W 6V Unidirecional SMD
Diodo TVS 600W 6V Unidirecional SMD SMBJ DO-214AA; Manufacturer Part Number: SMBJ60A-E3/52; Max Surge Current: 6.2A; Reverse Breakdown Voltage: 66.7V; Element Configuration: Single; Clamping Voltage-Max: 96.8V; Test Current: 1mA; Reverse Standoff Voltage: 60V; ESD Protection: No; Max Reverse Leakage Current: 1uA; Direction: Unidirectional; Number of Channels: 1; Max Breakdown Voltage: 73.7V; Length: 5.59mm; Termination: SMD/SMT; RoHS Compliant: Yes; Max Operating Temperature: 150°C; Series: SMBJ; Radiation Hardening: No; Package Quantity: 750; Min Operating Temperature: -55°C; Contact Plating: Tin,Matte; Peak Pulse Power: 600W; Packaging: Tape and Reel; Power Dissipation: 600W; Number of Pins: 2; Height: 2.44mm; Operating Supply Voltage: 60V; Clamping Voltage: 96.8V; Breakdown Voltage: 66.7V; Min Breakdown Voltage: 66.7V; Case/Package: SMB; Mount: Surface Mount; Polarity: Unidirectional; Width: 3.94mm; Lead Free: Lead Free; Peak Pulse Current: 6.2A; Leakage Current: 1uA; Max Power Dissipation: 600W; Number of Elements: 1
footprint SOD-523
footprint DO-214AA(SMB)-6
pins: 1 A, 2 K

## CMP-004-00034-1
designator D?, comment DIODE GEN PURP 1KV 1A
DIODE GEN PURP 1KV 1A DO214AC; Manufacturer Part Number: GS1M-LTP; Peak Non-Repetitive Surge Current: 30A; Max Reverse Current: 10uA; Forward Voltage: 1V; Element Configuration: Single; Radiation Hardening: No; Reverse Voltage: 1kV; Mount: Surface Mount; Number of Pins: 2; Average Rectified Current: 1A; Max Forward Surge Current (Ifsm): 30A; REACH SVHC: Unknown; Max Operating Temperature: 150°C; Max Surge Current: 30A; Max Reverse Voltage (DC): 1kV; Min Operating Temperature: -55°C; Max Repetitive Reverse Voltage (Vrrm): 1kV; Packaging: Tape and Reel; Package Quantity: 1; Forward Current: 1A; Case/Package: DO-214AC; Lead Free: Lead Free; RoHS Compliant: Yes
footprint SOD-323
footprint DO-214AC (RM2000E-TP FOOTPRINT)
pins: A, K

## CMP-004-000034-3
designator C?, comment CAP CER 75pF 50V NP0 0805 SMD  Packaging: Tape and Reel  Lead Pitch: 0.75mm  Max Operating Temperature: 125°C  Package Quantity: 4000  Min Operating Temperature: -55°C  Case/Package: 0805  Voltage Rating: 50V  Capacitance: 75pF  Tolerance: 5%  RoHS Compliant: Yes
Cap Ceramic 75pF 50V C0G 5% SMD 0805 125°C Plastic T/R; Case Code (Metric): 2012; Termination: SMD/SMT; Width: 0.049inch; Voltage Rating (DC): 50V; Lead Free: Lead Free; Dielectric Material: Ceramic; Series: C; Depth: 1.25mm; Case Code (Imperial): 0805; Mount: Surface Mount; Length: 0.079inch; Thickness: 0.035inch; Dielectric: C0G
footprint CC1005-0402 (Chip Capacitor; Body 0.039" L x 0.020" W (1.00mm x 0.50mm))
footprint CC2012-0805 (Chip Capacitor)
pins: 1, 2

## CMP-004-00035-1
designator D?, comment TVS DIODE 2.8VWM 15VC
TVS DIODE 2.8VWM 15VC SOT23-3; Manufacturer Part Number: SLVU2.8HTG; Diode Type: ZENER; Leakage Current: 1uA; ESD Protection: Yes; Element Configuration: Dual; Polarity: Unidirectional; Number of Bidirectional Channels: 1; Reverse Standoff Voltage: 2.8V; Breakdown Voltage: 3V; Clamping Voltage: 15V; Peak Pulse Power: 600W; Capacitance: 2.5pF; Power Line Protection: No; Peak Pulse Current: 40A; REACH SVHC: No SVHC; Length: 3.04mm; Series: SLVU2.8, SPA®; Width: 1.4mm; Max Operating Temperature: 85°C; Depth: 1.4mm; Max Reverse Leakage Current: 1uA; Resistor Type: Zener; Height: 1.02mm; Mount: Surface Mount; Min Breakdown Voltage: 3V; Operating Supply Voltage: 2.8V; RoHS Compliant: Yes; Termination: SMD/SMT; Case/Package: SOT-23; Radiation Hardening: No; Direction: Unidirectional; Packaging: Tape and Reel; Number of Pins: 3; Min Operating Temperature: -40°C; Max Surge Current: 40A; Working Voltage: 2.8V; Lead Free: Lead Free; Number of Channels: 1
footprint SOD-523
footprint SOT-23
pins: 1 A, 2 K

## CMP-004-000035-3
designator C?, comment CAP ALUM 330UF 20% 35V SMD 8MM  Voltage Rating: 35V  Package Quantity: 500  Ripple Current: 850mA  Min Operating Temperature: -55°C  Max Operating Temperature: 105°C  Manufacturer: Panasonic Electronic Components  Diameter: 8mm  Capacitance: 330uF  Packaging: Tape and Reel  Lead Pitch: 3.1mm  RoHS Compliant: Yes  Tolerance: 20%  Case/Package: Radial
CAP ALUM 330UF 20% 35V SMD; Part#: EEE-FT1V331AP; Leakage Current: 115.5uA; ESR (Equivalent Series Resistance): 80mR; eVendor: Digi-Key; eVendor#: PCE5018CT-ND; Dielectric Material: Aluminium; MSRP: 0,5892; Life (Hours): 2000Hour; Lead Diameter: 0.9mm; eVendorPrice: 1,10; Construction: Cylindrical; Datasheet: http://industrial.panasonic.com/lecs/www-data/pdf/ABA0000/ABA0000CE135.pdf; Contact Plating: Tin; Lead Free: Lead Free; Voltage Rating (DC): 35V; Series: FT; Termination: SMD/SMT; Features: General Purpose; Voltage: 35V; Radiation Hardening: No; Ripple Current (AC): 850mA; Length: 10.2mm; MOQ: 250; REACH SVHC: No SVHC; Design Item ID: CAP ALUM 330UF 20% 35V SMD 8MM; Height: 10.2mm; Height - Seated (Max): 0.413inch; Mount: Surface Mount,PCB; Number of Pins: 2
footprint CAP_SMD_D5_H6
footprint CAP_SMD_D80_P31_H100
pins: 1, 2
1 alternate drawing of the same symbol

## CMP-004-000036-2
designator C?, comment CAP CER 10UF 6.3V X5R 0603 SMD  RoHS Compliant: Yes  Max Operating Temperature: 85°C  Manufacturer: Samsung  Voltage Rating: 6.3V  Tolerance: 20%  Packaging: Tape and Reel  Capacitance: 10uF  Min Operating Temperature: -55°C  Package Quantity: 1  Case/Package: 0603
Ceramic capacitor SMD-0603 10uF /6.3V X5R# M +-20%, Samsung, RoHS; Manufacturer Part Number: CL10A106MQ8NNNC; Radiation Hardening: No; Voltage: 6.3V; Dielectric: X5R; Thickness: 0.035inch; Case Code (Imperial): 0603; Depth: 0.8mm; Width: 0.031inch; Stock 1: 4914950; ComponentLink1URL: https://datasheet.ciiva.com/25798/cl10a106mq8nnnc-25798320.pdf?src-supplier=Digi-Key; RoHS: Yes; Construction: Flat; ComponentLink2URL: https://datasheet.ciiva.com/26838/getdatasheetpartid-357557-26838347.pdf?src-supplier=Verical; Mount: Surface Mount; ComponentLink1Description: https://datasheet.ciiva.com/25798/cl10a106mq8nnnc-25798320.pdf?src-supplier=Digi-Key; Series: CL; Length: 1.6mm; Height: 0.8mm; Source: mits.SchLib; Contact Plating: Tin; ComponentLink2Description: https://datasheet.ciiva.com/26838/getdatasheetpartid-357557-26838347.pdf?src-supplier=Verical; ComponentLink3Description: https://datasheet.ciiva.com/16437/cl05b104kq5nnnc-16437327.pdf?src-supplier=Future+Electronics; ComponentLink3URL: https://datasheet.ciiva.com/16437/cl05b104kq5nnnc-16437327.pdf?src-supplier=Future+Electronics; Case Code (Metric): 1608; Category: Ceramic Capacitors; Design Item ID: CAP CER 10UF 6.3V X5R 0603 SMD; Pricing 1: 50=0,01570, 500=0,01220, 1500=0,01120, 5000=0,01010, 25000=0,00950, 50000=0,00940, 50=0,01500, 500=0,01160, 1500=0,01080, 5000=0,00960, 25000=0,00910, 50000=0,00900, 50=0,07880, 500=0,06110, 1500=0,05650, 5000=0,05060, 25000=0,04790, 50000=0,04730, 50=0,07560, 500=0,05860, 1500=0,05420, 5000=0,04850, 25000=0,04600, 50000=0,04530, 50=0,01020, 500=0,00790, 1500=0,00730, 5000=0,00650, 25000=0,00620, 50000=0,00610, 50=0,00860, 500=0,00670, 1500=0,00620, 5000=0,00550, 25000=0,00530, 50000=0,00520, 50=0,09330, 500=0,07230, 1500=0,06690, 5000=0,05990, 25000=0,05680, 50000=0,05600, 50=1,32290, 500=1,02520, 1500=0,94810, 5000=0,84880, 25000=0,80470, 50000=0,79370, 50=0,04960, 500=0,03850, 1500=0,03560, 5000=0,03180, 25000=0,03020, 50000=0,02980, 50=0,91850, 500=0,71190, 1500=0,65830, 5000=0,58940, 25000=0,55880, 50000=0,55110, 50=0,10450, 500=0,08100, 1500=0,07490, 5000=0,06710, 25000=0,06360, 50000=0,06270, 50=0,01610, 500=0,01250, 1500=0,01150, 5000=0,01030, 25000=0,00980, 50000=0,00970, 50=0,01200, 500=0,00930, 1500=0,00860, 5000=0,00770, 25000=0,00730, 50000=0,00720 (AUD)
footprint CC1005-0402 (Chip Capacitor; Body 0.039" L x 0.020" W (1.00mm x 0.50mm))
footprint CC1608-0603 (Chip Capacitor; Body 1.6 x 0.8 mm (LxW typ))
pins: 1, 2

## CMP-004-000037-2
designator C?, comment CAP CER 3.3pF 50V NPO 0603 SMD  RoHS Compliant: Yes  Voltage Rating: 50V  Min Operating Temperature: -55°C  Packaging: Tape and Reel  Package Quantity: 1  Manufacturer: Samsung  Capacitance: 3.3pF  Case/Package: 0603  Max Operating Temperature: 125°C
Capacitor 3.3 pF 50 VDC PU=4000 ST, CL10C3R3BB8NNNC, Samsung; Dielectric: C0G; Material: Ceramic; Mount: Surface Mount; ComponentLink4Description: https://datasheet.ciiva.com/26310/mlcc-catalogdownload2013-eng-26310254.pdf?src-supplier=Distrelec; ComponentLink4URL: https://datasheet.ciiva.com/26310/mlcc-catalogdownload2013-eng-26310254.pdf?src-supplier=Distrelec; Pricing 1: 50=0,01060, 500=0,00780, 1500=0,00750, 5000=0,00690, 25000=0,00670, 50000=0,00650, 50=0,01020, 500=0,00760, 1500=0,00720, 5000=0,00670, 25000=0,00640, 50000=0,00630, 50=0,05320, 500=0,03940, 1500=0,03750, 5000=0,03480, 25000=0,03350, 50000=0,03290, 50=0,05120, 500=0,03790, 1500=0,03600, 5000=0,03350, 25000=0,03220, 50000=0,03160, 50=0,00690, 500=0,00510, 1500=0,00480, 5000=0,00450, 25000=0,00430, 50000=0,00420, 50=0,00590, 500=0,00440, 1500=0,00410, 5000=0,00380, 25000=0,00370, 50000=0,00360, 50=0,06300, 500=0,04660, 1500=0,04430, 5000=0,04120, 25000=0,03960, 50000=0,03890, 50=0,88990, 500=0,65920, 1500=0,62620, 5000=0,58230, 25000=0,56030, 50000=0,54930, 50=0,03360, 500=0,02490, 1500=0,02360, 5000=0,02200, 25000=0,02110, 50000=0,02070, 50=0,61280, 500=0,45390, 1500=0,43120, 5000=0,40090, 25000=0,38580, 50000=0,37830, 50=0,07030, 500=0,05210, 1500=0,04950, 5000=0,04600, 25000=0,04430, 50000=0,04340, 50=0,01090, 500=0,00810, 1500=0,00770, 5000=0,00710, 25000=0,00690, 50000=0,00670, 50=0,00810, 500=0,00600, 1500=0,00570, 5000=0,00530, 25000=0,00510, 50000=0,00500 (AUD); ComponentLink1Description: https://datasheet.ciiva.com/26878/getdatasheetpartid-660248-26878000.pdf?src-supplier=Verical; Thickness: 0.035inch; Design Item ID: CAP CER 3.3pF 50V NPO 0603 SMD; ComponentLink1URL: https://datasheet.ciiva.com/26878/getdatasheetpartid-660248-26878000.pdf?src-supplier=Verical; Series: CL; RoHS: Yes; Source: mits.SchLib; Radiation Hardening: No; ComponentLink2URL: https://datasheet.ciiva.com/29198/457834-da-01-en-vs-kondensator-0603-29198571.pdf?src-supplier=Conrad; ComponentLink3Description: https://datasheet.ciiva.com/16437/cl05b104kq5nnnc-16437286.pdf?src-supplier=Future+Electronics; Case Code (Imperial): 0603; Length: 1.6mm; Stock 1: 63400; Category: Ceramic Capacitors; Width: 0.031inch; ComponentLink3URL: https://datasheet.ciiva.com/16437/cl05b104kq5nnnc-16437286.pdf?src-supplier=Future+Electronics; Depth: 0.8mm; ComponentLink2Description: https://datasheet.ciiva.com/29198/457834-da-01-en-vs-kondensator-0603-29198571.pdf?src-supplier=Conrad; Case Code (Metric): 1608; Height: 0.8mm; Construction: Flat; Manufacturer Part Number: CL10C3R3BB8NNNC
footprint CC1005-0402 (Chip Capacitor; Body 0.039" L x 0.020" W (1.00mm x 0.50mm))
footprint CC1608-0603 (Chip Capacitor; Body 1.6 x 0.8 mm (LxW typ))
pins: 1, 2